# Altium footprint library RDM_ALT_PCB.PcbLib: 129 footprints (part 9 of 9)
Each footprint in its own frame and in the unit in brackets; x right, y up, seen from the top. Pads: shape width x height; smd on the part's side, far side on the other; paste and mask are expansions set on the pad; w line width, h text height; cw(c..) or ccw(c..) is an arc to the next point about the centre after c.
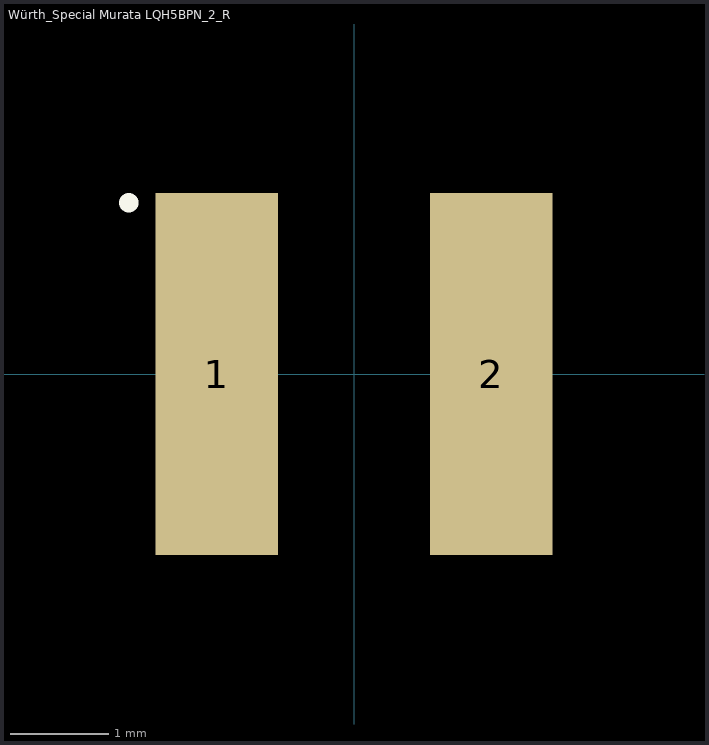
[diagram p8: the footprint, top view; thin cyan lines are the x and y axes]

## Würth_Special Murata LQH5BPN_2_R [mm] "Würth_Special Murata LQH5BPN_2_R"
height 4
pads (2):
  rect 1.25x3.7 smd: 1(-1.4,0) 2(1.4,0)
Top Overlay:
  circle w0.2: c-2.3,1.75 r0
3D body: height 4, standoff 0, extent -2.45,-2.45 2.45,2.45
3D body "STEP-WE-MAPI-4030-rev1.stp": height 3.1, standoff 0, extent -2.05,-2.05 2.05,2.05